# Altium footprint library SMDLibrary.PcbLib: 306 footprints (part 15 of 20)
Each footprint in its own frame and in the unit in brackets; x right, y up, seen from the top. Pads: shape width x height; smd on the part's side, far side on the other; paste and mask are expansions set on the pad; w line width, h text height; cw(c..) or ccw(c..) is an arc to the next point about the centre after c.
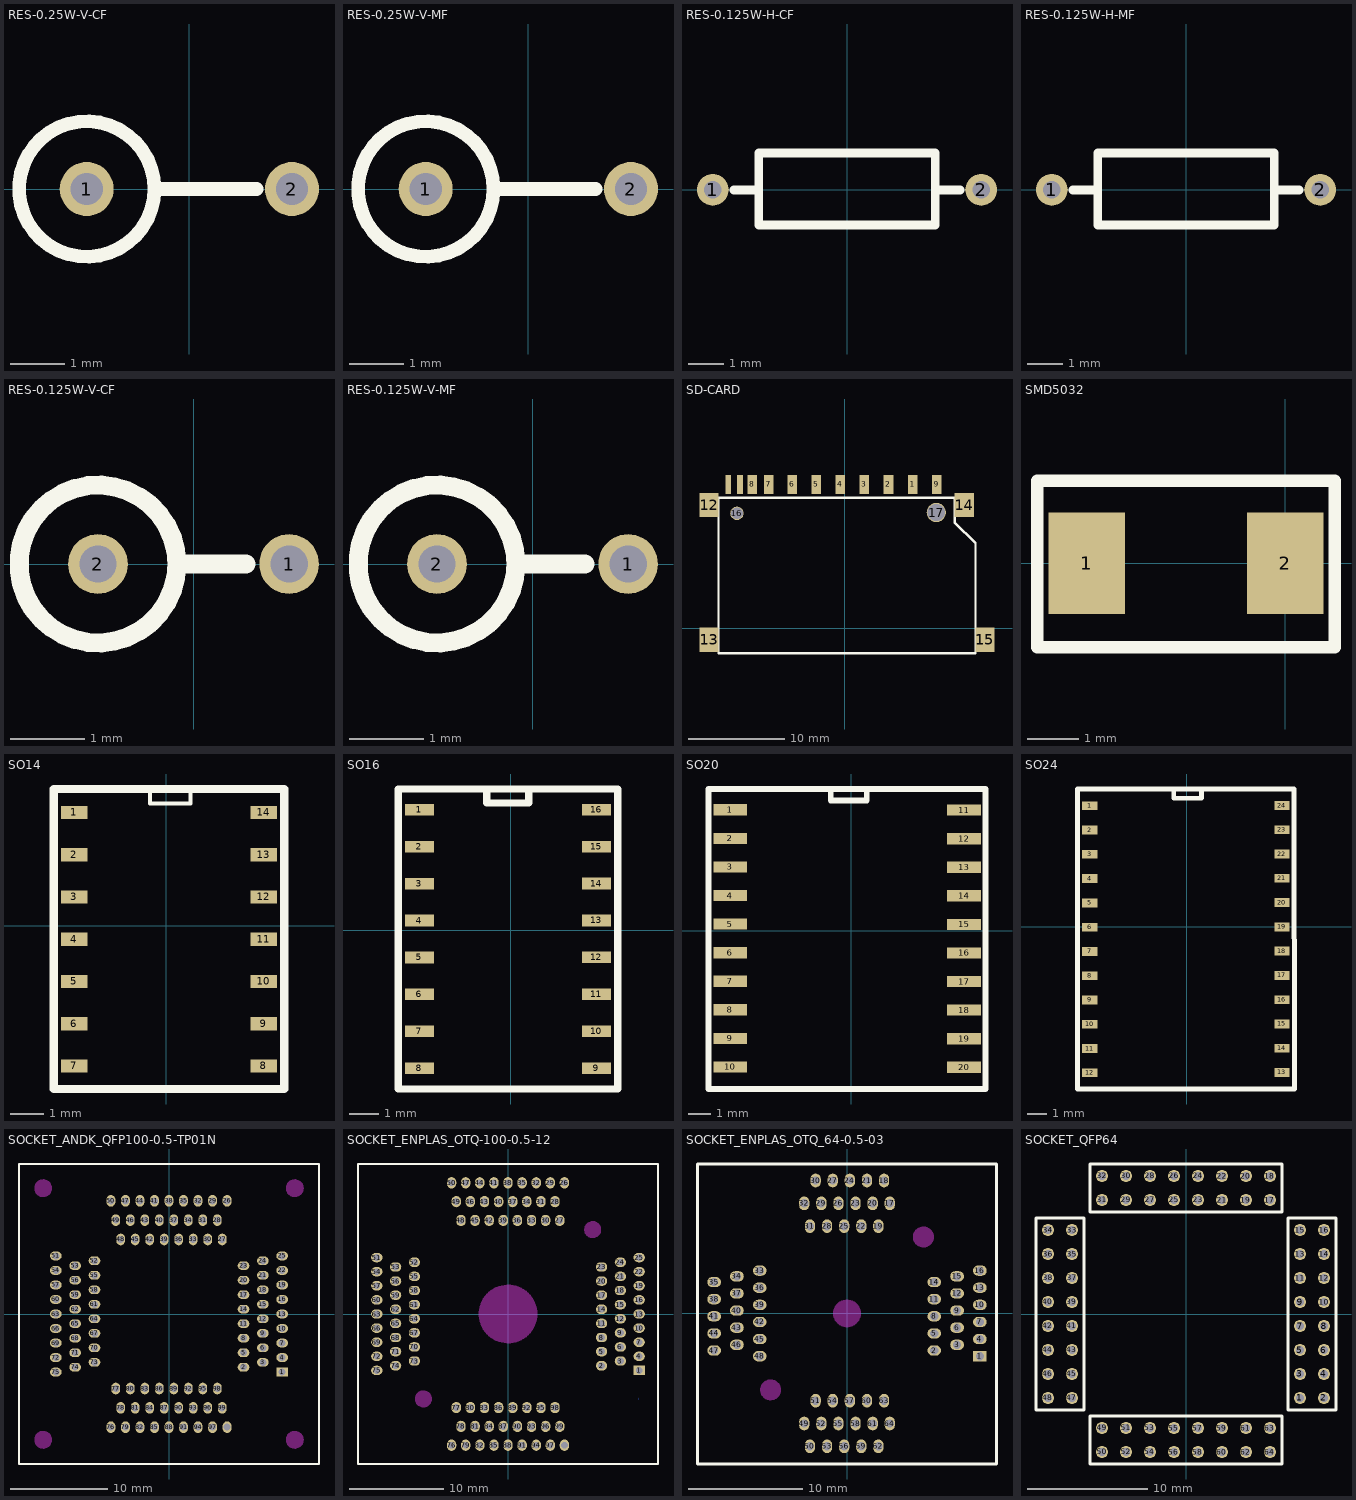
[diagram p14: the footprints below, top view; thin cyan lines are the x and y axes]

## RES-0.25W-V-CF [mm]
pads (2):
  round 1 hole 0.6: 1(-1.9,0) 2(1.9,0)
Top Overlay:
  circle w0.254: c-1.9,0 r1.254
  lines w0.254: -0.646,0 1.25,0
3D body "RES-0.25W-V-CF.stp": height 9.5, standoff -2.5, extent -3.195,-1.297 2.178,1.298

## RES-0.25W-V-MF [mm]
pads (2):
  round 1 hole 0.6: 1(-1.9,0) 2(1.9,0)
Top Overlay:
  circle w0.254: c-1.9,0 r1.254
  lines w0.254: -0.646,0 1.25,0
3D body "RES-0.25W-V-MF.stp": height 9.5, standoff -2.5, extent -3.195,-1.297 2.178,1.298

## RES-0.125W-H-CF [mm]
pads (2):
  round 0.9 hole 0.5: 1(-3.8,0) 2(3.8,0)
Top Overlay:
  lines w0.254: -3.2,0 -2.5,0 ; 2.5,0 3.2,0 ; -2.5,-1 -2.5,1.05 2.5,1.05 2.5,-1 -2.5,-1
3D body "RES-0.125W-H-CF.stp": height 2.2, standoff -2.5, extent -4.033,-1.039 4.035,1.039

## RES-0.125W-H-MF [mm]
pads (2):
  round 0.9 hole 0.5: 1(-3.8,0) 2(3.8,0)
Top Overlay:
  lines w0.254: -3.2,0 -2.5,0 ; 2.5,0 3.2,0 ; -2.5,-1 -2.5,1.05 2.5,1.05 2.5,-1 -2.5,-1
3D body "RES-0.125W-H-MF.stp": height 2.2, standoff -2.5, extent -4.033,-1.039 4.035,1.04

## RES-0.125W-V-CF [mm]
pads (2):
  round 0.8 hole 0.5: 1(1.28,0) 2(-1.28,0)
Top Overlay:
  circle w0.254: c-1.28,0 r1.057
  lines w0.254: -0.2,0 0.7,0
3D body "RES-0.125W-V-CF.stp": height 5.73, standoff -2.5, extent -2.32,-1.039 1.493,1.039

## RES-0.125W-V-MF [mm]
pads (2):
  round 0.8 hole 0.5: 1(1.28,0) 2(-1.28,0)
Top Overlay:
  circle w0.254: c-1.28,0 r1.057
  lines w0.254: -0.2,0 0.7,0
3D body "RES-0.125W-V-MF.stp": height 5.73, standoff -2.5, extent -2.32,-1.039 1.493,1.04

## SD-CARD [mm]
pads (17):
  rect 1x2 smd: 1(7.057,14.947) 2(4.557,14.947) 3(2.057,14.947) 4(-0.443,14.947) 5(-2.943,14.947) 6(-5.443,14.947) 7(-7.868,14.947) 8(-9.568,14.947) 9(9.557,14.947)
  rect 0.6x2 smd: 10(-10.868,14.947) 11(-12.068,14.947)
  rect 2x2.5 smd: 12(-14.068,12.788) 13(-14.068,-1.182) 14(12.411,12.788) 15(14.57,-1.182)
  round 1.4 hole 1.2: 16(-11.168,11.947)
  round 2 hole 1.8: 17(9.522,12.026)
Top Overlay:
  lines w0.254: -13.084,-2.579 13.586,-2.579 13.586,8.851 11.427,11.01 11.427,13.55 -13.084,13.55 -13.084,-2.579
3D body "User Library-SD Kart.step": height 3, standoff -1, extent -14.151,-15.256 14.449,14.744

## SMD5032 [mm]
pads (2):
  rect 1.5x2 smd: 1(-3.9,0) 2(0,0)
Top Overlay:
  lines w0.254: -4.875,-1.65 -4.875,1.625 0.975,1.625 0.975,-1.65 -4.875,-1.65
3D body "User Library-5032_2.STEP": height 1.2, standoff -0.01, extent -4.453,-1.603 0.547,1.597

## SO14 [mm]
pads (14):
  rect 0.8x0.4 smd: 1(-2.76,3.41) 2(-2.76,2.14) 3(-2.76,0.87) 4(-2.76,-0.4) 5(-2.76,-1.67) 6(-2.76,-2.94) 7(-2.76,-4.21) 8(2.935,-4.21) 9(2.935,-2.94) 10(2.935,-1.67) 11(2.935,-0.4) 12(2.935,0.87) 13(2.935,2.14) 14(2.935,3.41)
Top Overlay:
  lines w0.12: -0.483,4.115 -0.483,3.683 0.737,3.683 0.737,4.115
  lines w0.254: -3.378,-4.902 3.556,-4.902 3.556,4.115 -3.378,4.115 -3.378,-4.902
3D body "SW3DPS-SO-14 (PIC16F684)-DEFAULT.STEP": height 1.6, standoff 0, extent -2.92,-4.745 3.07,3.945

## SO16 [mm]
pads (16):
  rect 1x0.4 smd: 1(-3.137,4.14) 2(-3.137,2.87) 3(-3.137,1.6) 4(-3.137,0.33) 5(-3.137,-0.94) 6(-3.137,-2.21) 7(-3.137,-3.48) 8(-3.137,-4.75) 9(2.948,-4.747) 10(2.948,-3.477) 11(2.948,-2.207) 12(2.948,-0.937) 13(2.948,0.333) 14(2.948,1.603) 15(2.948,2.873) 16(2.948,4.143)
Top Overlay:
  lines w0.254: -0.826,4.851 -0.826,4.369 0.622,4.369 0.622,4.686 ; -3.861,-5.461 3.683,-5.461 3.683,4.851 -3.861,4.851 -3.861,-5.461
3D body "User Library-so16-1.STEP": height 1.75, standoff -0.02, extent -3.17,-5.29 2.967,4.68

## SO20 [mm]
pads (20):
  rect 1.5x0.5 smd: 1(-5.383,5.374) 2(-5.383,4.104) 3(-5.383,2.834) 4(-5.383,1.564) 5(-5.383,0.294) 6(-5.383,-0.976) 7(-5.383,-2.246) 8(-5.383,-3.516) 9(-5.383,-4.786) 10(-5.383,-6.056) 11(5.01,5.362) 12(5.01,4.092) 13(5.01,2.822) 14(5.01,1.552) 15(5.01,0.282) 16(5.01,-0.988) 17(5.01,-2.258) 18(5.01,-3.528) 19(5.01,-4.798) 20(5.01,-6.068)
Top Overlay:
  lines w0.254: -0.914,6.248 -0.914,5.791 0.686,5.791 0.686,6.248 ; -6.35,-7.036 5.969,-7.036 5.969,6.299 -6.35,6.299 -6.35,-7.036
3D body "User Library-SOIC20_JEDEC_MS-013AC.STEP": height 2.66, standoff 0, extent -5.536,-6.851 5.094,6.149

## SO24 [mm]
pads (24):
  rect 0.8x0.46 smd: 1(-5.075,6.335) 2(-5.075,5.065) 3(-5.075,3.795) 4(-5.075,2.525) 5(-5.075,1.255) 6(-5.075,-0.015) 7(-5.075,-1.285) 8(-5.075,-2.555) 9(-5.075,-3.825) 10(-5.075,-5.095) 11(-5.075,-6.365) 12(-5.075,-7.635) 13(4.975,-7.62) 14(4.975,-6.35) 15(4.975,-5.08) 16(4.975,-3.81) 17(4.975,-2.54) 18(4.975,-1.27) 19(4.975,0) 20(4.975,1.27) 21(4.975,2.54) 22(4.975,3.81) 23(4.975,5.08) 24(4.975,6.35)
Top Overlay:
  lines w0.254: -0.686,7.188 -0.686,6.731 0.762,6.731 0.762,7.163 ; -5.715,-8.484 -5.715,7.214 5.601,7.214 5.627,-8.484 -5.715,-8.484
3D body "User Library-SO-24W.STEP": height 2.48, standoff 0, extent -5.205,-8.36 5.105,7.05

## SOCKET_ANDK_QFP100-0.5-TP01N [mm]
pads (100):
  rect 1.2x0.9 hole 0.72: 1(11.7,-6)
  oval 1.2x0.9 hole 0.72: 2(7.7,-5.5) 3(9.7,-5) 4(11.7,-4.5) 5(7.7,-4) 6(9.7,-3.5) 7(11.7,-3) 8(7.7,-2.5) 9(9.7,-2) 10(11.7,-1.5) 11(7.7,-1) 12(9.7,-0.5) 13(11.7,0) 14(7.7,0.5) 15(9.7,1) 16(11.7,1.5) 17(7.7,2) 18(9.7,2.5) 19(11.7,3) 20(7.7,3.5) 21(9.7,4) 22(11.7,4.5) 23(7.7,5) 24(9.7,5.5) 25(11.7,6) 51(-11.7,6) 52(-7.7,5.5) 53(-9.7,5) 54(-11.7,4.5) 55(-7.7,4) 56(-9.7,3.5) 57(-11.7,3) 58(-7.7,2.5) 59(-9.7,2) 60(-11.7,1.5) 61(-7.7,1) 62(-9.7,0.5) 63(-11.7,0) 64(-7.7,-0.5) 65(-9.7,-1) 66(-11.7,-1.5) 67(-7.7,-2) 68(-9.7,-2.5) 69(-11.7,-3) 70(-7.7,-3.5) 71(-9.7,-4) 72(-11.7,-4.5) 73(-7.7,-5) 74(-9.7,-5.5) 75(-11.7,-6)
  oval 0.9x1.2 hole 0.72: 26(6,11.7) 27(5.5,7.7) 28(5,9.7) 29(4.5,11.7) 30(4,7.7) 31(3.5,9.7) 32(3,11.7) 33(2.5,7.7) 34(2,9.7) 35(1.5,11.7) 36(1,7.7) 37(0.5,9.7) 38(0,11.7) 39(-0.5,7.7) 40(-1,9.7) 41(-1.5,11.7) 42(-2,7.7) 43(-2.5,9.7) 44(-3,11.7) 45(-3.5,7.7) 46(-4,9.7) 47(-4.5,11.7) 48(-5,7.7) 49(-5.5,9.7) 50(-6,11.7) 76(-6,-11.7) 77(-5.5,-7.7) 78(-5,-9.7) 79(-4.5,-11.7) 80(-4,-7.7) 81(-3.5,-9.7) 82(-3,-11.7) 83(-2.5,-7.7) 84(-2,-9.7) 85(-1.5,-11.7) 86(-1,-7.7) 87(-0.5,-9.7) 88(0,-11.7) 89(0.5,-7.7) 90(1,-9.7) 91(1.5,-11.7) 92(2,-7.7) 93(2.5,-9.7) 94(3,-11.7) 95(3.5,-7.7) 96(4,-9.7) 97(4.5,-11.7) 98(5,-7.7) 99(5.5,-9.7) 100(6,-11.7)
Top Overlay:
  lines w0.254: -15.5,-15.5 15.5,-15.5 15.5,15.5 -15.5,15.5 -15.5,-15.5
Keep-Out Layer:
  board cut-out: -13,12.2 -13.079,12.2 -13.233,12.231 -13.379,12.291 -13.51,12.379 -13.621,12.49 -13.709,12.621 -13.769,12.767 -13.8,12.921 -13.8,13 -13.8,13.079 -13.769,13.233 -13.709,13.379 -13.621,13.51 -13.51,13.621 -13.379,13.709 -13.233,13.769 -13.079,13.8 -13,13.8 -12.921,13.8 -12.767,13.769 -12.621,13.709 -12.49,13.621 -12.379,13.51 -12.291,13.379 -12.231,13.233 -12.2,13.079 -12.2,13 -12.2,12.921 -12.231,12.767 -12.291,12.621 -12.379,12.49 -12.49,12.379 -12.621,12.291 -12.767,12.231 -12.921,12.2
  board cut-out: 13,12.2 12.921,12.2 12.767,12.231 12.621,12.291 12.49,12.379 12.379,12.49 12.291,12.621 12.231,12.767 12.2,12.921 12.2,13 12.2,13.079 12.231,13.233 12.291,13.379 12.379,13.51 12.49,13.621 12.621,13.709 12.767,13.769 12.921,13.8 13,13.8 13.079,13.8 13.233,13.769 13.379,13.709 13.51,13.621 13.621,13.51 13.709,13.379 13.769,13.233 13.8,13.079 13.8,13 13.8,12.921 13.769,12.767 13.709,12.621 13.621,12.49 13.51,12.379 13.379,12.291 13.233,12.231 13.079,12.2
  board cut-out: 12.2,-13 12.2,-13.079 12.231,-13.233 12.291,-13.379 12.379,-13.51 12.49,-13.621 12.621,-13.709 12.767,-13.769 12.921,-13.8 13,-13.8 13.079,-13.8 13.233,-13.769 13.379,-13.709 13.51,-13.621 13.621,-13.51 13.709,-13.379 13.769,-13.233 13.8,-13.079 13.8,-13 13.8,-12.921 13.769,-12.767 13.709,-12.621 13.621,-12.49 13.51,-12.379 13.379,-12.291 13.233,-12.231 13.079,-12.2 13,-12.2 12.921,-12.2 12.767,-12.231 12.621,-12.291 12.49,-12.379 12.379,-12.49 12.291,-12.621 12.231,-12.767 12.2,-12.921
  board cut-out: -13,-13.8 -13.079,-13.8 -13.233,-13.769 -13.379,-13.709 -13.51,-13.621 -13.621,-13.51 -13.709,-13.379 -13.769,-13.233 -13.8,-13.079 -13.8,-13 -13.8,-12.921 -13.769,-12.767 -13.709,-12.621 -13.621,-12.49 -13.51,-12.379 -13.379,-12.291 -13.233,-12.231 -13.079,-12.2 -13,-12.2 -12.921,-12.2 -12.767,-12.231 -12.621,-12.291 -12.49,-12.379 -12.379,-12.49 -12.291,-12.621 -12.231,-12.767 -12.2,-12.921 -12.2,-13 -12.2,-13.079 -12.231,-13.233 -12.291,-13.379 -12.379,-13.51 -12.49,-13.621 -12.621,-13.709 -12.767,-13.769 -12.921,-13.8
Keep-Out Layer:
  circle w0.254: c-13,13 r0.8
  circle w0.254: c13,13 r0.8
  circle w0.254: c13,-13 r0.8
  circle w0.254: c-13,-13 r0.8

## SOCKET_ENPLAS_OTQ-100-0.5-12 [mm]
pads (100):
  rect 1.2x1 hole 0.72: 1(13.95,-6)
  oval 1.2x1 hole 0.72: 2(9.95,-5.5) 3(11.95,-5) 4(13.95,-4.5) 5(9.95,-4) 6(11.95,-3.5) 7(13.95,-3) 8(9.95,-2.5) 9(11.95,-2) 10(13.95,-1.5) 11(9.95,-1) 12(11.95,-0.5) 13(13.95,0) 14(9.95,0.5) 15(11.95,1) 16(13.95,1.5) 17(9.95,2) 18(11.95,2.5) 19(13.95,3) 20(9.95,3.5) 21(11.95,4) 22(13.95,4.5) 23(9.95,5) 24(11.95,5.5) 25(13.95,6) 51(-13.95,6) 52(-9.95,5.5) 53(-11.95,5) 54(-13.95,4.5) 55(-9.95,4) 56(-11.95,3.5) 57(-13.95,3) 58(-9.95,2.5) 59(-11.95,2) 60(-13.95,1.5) 61(-9.95,1) 62(-11.95,0.5) 63(-13.95,0) 64(-9.95,-0.5) 65(-11.95,-1) 66(-13.95,-1.5) 67(-9.95,-2) 68(-11.95,-2.5) 69(-13.95,-3) 70(-9.95,-3.5) 71(-11.95,-4) 72(-13.95,-4.5) 73(-9.95,-5) 74(-11.95,-5.5) 75(-13.95,-6)
  oval 1x1.2 hole 0.72: 26(6,13.95) 27(5.5,9.95) 28(5,11.95) 29(4.5,13.95) 30(4,9.95) 31(3.5,11.95) 32(3,13.95) 33(2.5,9.95) 34(2,11.95) 35(1.5,13.95) 36(1,9.95) 37(0.5,11.95) 38(0,13.95) 39(-0.5,9.95) 40(-1,11.95) 41(-1.5,13.95) 42(-2,9.95) 43(-2.5,11.95) 44(-3,13.95) 45(-3.5,9.95) 46(-4,11.95) 47(-4.5,13.95) 48(-5,9.95) 49(-5.5,11.95) 50(-6,13.95) 76(-6,-13.95) 77(-5.5,-9.95) 78(-5,-11.95) 79(-4.5,-13.95) 80(-4,-9.95) 81(-3.5,-11.95) 82(-3,-13.95) 83(-2.5,-9.95) 84(-2,-11.95) 85(-1.5,-13.95) 86(-1,-9.95) 87(-0.5,-11.95) 88(0,-13.95) 89(0.5,-9.95) 90(1,-11.95) 91(1.5,-13.95) 92(2,-9.95) 93(2.5,-11.95) 94(3,-13.95) 95(3.5,-9.95) 96(4,-11.95) 97(4.5,-13.95) 98(5,-9.95) 99(5.5,-11.95) 100(6,-13.95)
Bottom Layer:
  region: 13.9,-8.889 13.9,-9.139
Top Overlay:
  lines w0.254: -15.95,-15.95 -15.95,15.95 15.95,15.95 15.95,-15.95 -15.95,-15.95
Keep-Out Layer:
  board cut-out: 9,8.2 8.921,8.2 8.767,8.231 8.621,8.291 8.49,8.379 8.379,8.49 8.291,8.621 8.231,8.767 8.2,8.921 8.2,9 8.2,9.079 8.231,9.233 8.291,9.379 8.379,9.51 8.49,9.621 8.621,9.709 8.767,9.769 8.921,9.8 9,9.8 9.079,9.8 9.233,9.769 9.379,9.709 9.51,9.621 9.621,9.51 9.709,9.379 9.769,9.233 9.8,9.079 9.8,9 9.8,8.921 9.769,8.767 9.709,8.621 9.621,8.49 9.51,8.379 9.379,8.291 9.233,8.231 9.079,8.2
  board cut-out: 0.027,-0.163
  board cut-out: 0,-3 -0.197,-3 -0.587,-2.949 -0.966,-2.847 -1.33,-2.696 -1.67,-2.5 -1.982,-2.26 -2.26,-1.982 -2.5,-1.67 -2.696,-1.33 -2.847,-0.966 -2.949,-0.587 -3,-0.197 -3,0 -3,0.197 -2.949,0.587 -2.847,0.966 -2.696,1.33 -2.5,1.67 -2.26,1.982 -1.982,2.26 -1.67,2.5 -1.33,2.696 -0.966,2.847 -0.587,2.949 -0.197,3 0,3 0.197,3 0.587,2.949 0.966,2.847 1.33,2.696 1.67,2.5 1.982,2.26 2.26,1.982 2.5,1.67 2.696,1.33 2.847,0.966 2.949,0.587 3,0.197 3,0 3,-0.197 2.949,-0.587 2.847,-0.966 2.696,-1.33 2.5,-1.67 2.26,-1.982 1.982,-2.26 1.67,-2.5 1.33,-2.696 0.966,-2.847 0.587,-2.949 0.197,-3
  board cut-out: -9,-9.8 -9.079,-9.8 -9.233,-9.769 -9.379,-9.709 -9.51,-9.621 -9.621,-9.51 -9.709,-9.379 -9.769,-9.233 -9.8,-9.079 -9.8,-9 -9.8,-8.921 -9.769,-8.767 -9.709,-8.621 -9.621,-8.49 -9.51,-8.379 -9.379,-8.291 -9.233,-8.231 -9.079,-8.2 -9,-8.2 -8.921,-8.2 -8.767,-8.231 -8.621,-8.291 -8.49,-8.379 -8.379,-8.49 -8.291,-8.621 -8.231,-8.767 -8.2,-8.921 -8.2,-9 -8.2,-9.079 -8.231,-9.233 -8.291,-9.379 -8.379,-9.51 -8.49,-9.621 -8.621,-9.709 -8.767,-9.769 -8.921,-9.8
Keep-Out Layer:
  circle w0.254: c9,8.975 r0.786
  circle w0.254: c-9,-9.025 r0.786
  circle w0.254: c0,0 r3

## SOCKET_ENPLAS_OTQ_64-0.5-03 [mm]
pads (64):
  rect 1.2x0.9 hole 0.72: 1(11.65,-3.75)
  oval 1.2x0.9 hole 0.72: 2(7.65,-3.25) 3(9.65,-2.75) 4(11.65,-2.25) 5(7.65,-1.75) 6(9.65,-1.25) 7(11.65,-0.75) 8(7.65,-0.25) 9(9.65,0.25) 10(11.65,0.75) 11(7.65,1.25) 12(9.65,1.75) 13(11.65,2.25) 14(7.65,2.75) 15(9.65,3.25) 16(11.65,3.75) 33(-7.65,3.75) 34(-9.65,3.25) 35(-11.65,2.75) 36(-7.65,2.25) 37(-9.65,1.75) 38(-11.65,1.25) 39(-7.65,0.75) 40(-9.65,0.25) 41(-11.65,-0.25) 42(-7.65,-0.75) 43(-9.65,-1.25) 44(-11.65,-1.75) 45(-7.65,-2.25) 46(-9.65,-2.75) 47(-11.65,-3.25) 48(-7.65,-3.75)
  oval 0.9x1.2 hole 0.72: 17(3.75,9.65) 18(3.25,11.65) 19(2.75,7.65) 20(2.25,9.65) 21(1.75,11.65) 22(1.25,7.65) 23(0.75,9.65) 24(0.25,11.65) 25(-0.25,7.65) 26(-0.75,9.65) 27(-1.25,11.65) 28(-1.75,7.65) 29(-2.25,9.65) 30(-2.75,11.65) 31(-3.25,7.65) 32(-3.75,9.65) 49(-3.75,-9.65) 50(-3.25,-11.65) 51(-2.75,-7.65) 52(-2.25,-9.65) 53(-1.75,-11.65) 54(-1.25,-7.65) 55(-0.75,-9.65) 56(-0.25,-11.65) 57(0.25,-7.65) 58(0.75,-9.65) 59(1.25,-11.65) 60(1.75,-7.65) 61(2.25,-9.65) 62(2.75,-11.65) 63(3.25,-7.65) 64(3.75,-9.65)
Top Overlay:
  lines w0.254: -13.1,-13.2 13.1,-13.2 13.1,13.1 0,13.1 -13.1,13.1 -13.1,-11.65 -13.1,-13.2
Keep-Out Layer:
  board cut-out: -6.7,-7.5 -6.779,-7.5 -6.933,-7.469 -7.079,-7.409 -7.21,-7.321 -7.321,-7.21 -7.409,-7.079 -7.469,-6.933 -7.5,-6.779 -7.5,-6.7 -7.5,-6.621 -7.469,-6.467 -7.409,-6.321 -7.321,-6.19 -7.21,-6.079 -7.079,-5.991 -6.933,-5.931 -6.779,-5.9 -6.7,-5.9 -6.621,-5.9 -6.467,-5.931 -6.321,-5.991 -6.19,-6.079 -6.079,-6.19 -5.991,-6.321 -5.931,-6.467 -5.9,-6.621 -5.9,-6.7 -5.9,-6.779 -5.931,-6.933 -5.991,-7.079 -6.079,-7.21 -6.19,-7.321 -6.321,-7.409 -6.467,-7.469 -6.621,-7.5
  board cut-out: 6.7,5.9 6.621,5.9 6.467,5.931 6.321,5.991 6.19,6.079 6.079,6.19 5.991,6.321 5.931,6.467 5.9,6.621 5.9,6.7 5.9,6.779 5.931,6.933 5.991,7.079 6.079,7.21 6.19,7.321 6.321,7.409 6.467,7.469 6.621,7.5 6.7,7.5 6.779,7.5 6.933,7.469 7.079,7.409 7.21,7.321 7.321,7.21 7.409,7.079 7.469,6.933 7.5,6.779 7.5,6.7 7.5,6.621 7.469,6.467 7.409,6.321 7.321,6.19 7.21,6.079 7.079,5.991 6.933,5.931 6.779,5.9
  board cut-out: 0,-1.1 -0.108,-1.1 -0.321,-1.058 -0.521,-0.975 -0.701,-0.854 -0.854,-0.701 -0.975,-0.521 -1.058,-0.321 -1.1,-0.108 -1.1,0 -1.1,0.108 -1.058,0.321 -0.975,0.521 -0.854,0.701 -0.701,0.854 -0.521,0.975 -0.321,1.058 -0.108,1.1 0,1.1 0.108,1.1 0.321,1.058 0.521,0.975 0.701,0.854 0.854,0.701 0.975,0.521 1.058,0.321 1.1,0.108 1.1,0 1.1,-0.108 1.058,-0.321 0.975,-0.521 0.854,-0.701 0.701,-0.854 0.521,-0.975 0.321,-1.058 0.108,-1.1
Keep-Out Layer:
  circle w0.254: c0,0 r1.1
  circle w0.254: c6.7,6.7 r0.8
  circle w0.254: c-6.7,-6.7 r0.8

## SOCKET_QFP64 [mm]
pads (64):
  round 1 hole 0.65: 1(9.5,-7) 2(11.5,-7) 3(9.5,-5) 4(11.5,-5) 5(9.5,-3) 6(11.5,-3) 7(9.5,-1) 8(11.5,-1) 9(9.5,1) 10(11.5,1) 11(9.5,3) 12(11.5,3) 13(9.5,5) 14(11.5,5) 15(9.5,7) 16(11.5,7) 17(7,9.5) 18(7,11.5) 19(5,9.5) 20(5,11.5) 21(3,9.5) 22(3,11.5) 23(1,9.5) 24(1,11.5) 25(-1,9.5) 26(-1,11.5) 27(-3,9.5) 28(-3,11.5) 29(-5,9.5) 30(-5,11.5) 31(-7,9.5) 32(-7,11.5) 33(-9.5,7) 34(-11.5,7) 35(-9.5,5) 36(-11.5,5) 37(-9.5,3) 38(-11.5,3) 39(-9.5,1) 40(-11.5,1) 41(-9.5,-1) 42(-11.5,-1) 43(-9.5,-3) 44(-11.5,-3) 45(-9.5,-5) 46(-11.5,-5) 47(-9.5,-7) 48(-11.5,-7) 49(-7,-9.5) 50(-7,-11.5) 51(-5,-9.5) 52(-5,-11.5) 53(-3,-9.5) 54(-3,-11.5) 55(-1,-9.5) 56(-1,-11.5) 57(1,-9.5) 58(1,-11.5) 59(3,-9.5) 60(3,-11.5) 61(5,-9.5) 62(5,-11.5) 63(7,-9.5) 64(7,-11.5)
Top Overlay:
  lines w0.254: -12.5,-8 -12.5,-8 ; -12.5,-8 -12.5,8 -8.5,8 -8.5,-8 -12.5,-8 ; -8,12.5 -8,12.5 ; -8,12.5 8,12.5 8,8.5 -8,8.5 -8,12.5 ; 8,-12.5 8,-12.5 ; 8,-12.5 -8,-12.5 -8,-8.5 8,-8.5 8,-12.5 ; 12.5,8 12.5,8 ; 12.5,8 12.5,-8 8.5,-8 8.5,8 12.5,8
3D body "pin header 1x1 pitch 2mm heigth 5mm.stp": height 6.01, standoff -2.69, extent -8,8.5 -6,10.5
3D body "pin header 1x1 pitch 2mm heigth 5mm.stp": height 6.01, standoff -2.69, extent -8,10.5 -6,12.5
3D body "pin header 1x1 pitch 2mm heigth 5mm.stp": height 6.01, standoff -2.69, extent -6,8.5 -4,10.5
3D body "pin header 1x1 pitch 2mm heigth 5mm.stp": height 6.01, standoff -2.69, extent -6,10.5 -4,12.5
3D body "pin header 1x1 pitch 2mm heigth 5mm.stp": height 6.01, standoff -2.69, extent -4,8.5 -2,10.5
3D body "pin header 1x1 pitch 2mm heigth 5mm.stp": height 6.01, standoff -2.69, extent -2,8.5 0,10.5
3D body "pin header 1x1 pitch 2mm heigth 5mm.stp": height 6.01, standoff -2.69, extent 0,8.5 2,10.5
3D body "pin header 1x1 pitch 2mm heigth 5mm.stp": height 6.01, standoff -2.69, extent -4,10.5 -2,12.5
3D body "pin header 1x1 pitch 2mm heigth 5mm.stp": height 6.01, standoff -2.69, extent -2,10.5 0,12.5
3D body "pin header 1x1 pitch 2mm heigth 5mm.stp": height 6.01, standoff -2.69, extent 0,10.5 2,12.5
3D body "pin header 1x1 pitch 2mm heigth 5mm.stp": height 6.01, standoff -2.69, extent 2,10.5 4,12.5
3D body "pin header 1x1 pitch 2mm heigth 5mm.stp": height 6.01, standoff -2.69, extent 2,8.5 4,10.5
3D body "pin header 1x1 pitch 2mm heigth 5mm.stp": height 6.01, standoff -2.69, extent 4,8.5 6,10.5
3D body "pin header 1x1 pitch 2mm heigth 5mm.stp": height 6.01, standoff -2.69, extent 4,10.5 6,12.5
3D body "pin header 1x1 pitch 2mm heigth 5mm.stp": height 6.01, standoff -2.69, extent 6,8.5 8,10.5
3D body "pin header 1x1 pitch 2mm heigth 5mm.stp": height 6.01, standoff -2.69, extent 6,10.5 8,12.5
3D body "pin header 1x1 pitch 2mm heigth 5mm.stp": height 6.01, standoff -2.69, extent -10.5,-8 -8.5,-6
3D body "pin header 1x1 pitch 2mm heigth 5mm.stp": height 6.01, standoff -2.69, extent -12.5,-8 -10.5,-6
3D body "pin header 1x1 pitch 2mm heigth 5mm.stp": height 6.01, standoff -2.69, extent -10.5,-6 -8.5,-4
3D body "pin header 1x1 pitch 2mm heigth 5mm.stp": height 6.01, standoff -2.69, extent -12.5,-6 -10.5,-4
3D body "pin header 1x1 pitch 2mm heigth 5mm.stp": height 6.01, standoff -2.69, extent -10.5,-4 -8.5,-2
3D body "pin header 1x1 pitch 2mm heigth 5mm.stp": height 6.01, standoff -2.69, extent -10.5,-2 -8.5,0
3D body "pin header 1x1 pitch 2mm heigth 5mm.stp": height 6.01, standoff -2.69, extent -10.5,0 -8.5,2
3D body "pin header 1x1 pitch 2mm heigth 5mm.stp": height 6.01, standoff -2.69, extent -12.5,-4 -10.5,-2
3D body "pin header 1x1 pitch 2mm heigth 5mm.stp": height 6.01, standoff -2.69, extent -12.5,-2 -10.5,0
3D body "pin header 1x1 pitch 2mm heigth 5mm.stp": height 6.01, standoff -2.69, extent -12.5,0 -10.5,2
3D body "pin header 1x1 pitch 2mm heigth 5mm.stp": height 6.01, standoff -2.69, extent -12.5,2 -10.5,4
3D body "pin header 1x1 pitch 2mm heigth 5mm.stp": height 6.01, standoff -2.69, extent -10.5,2 -8.5,4
3D body "pin header 1x1 pitch 2mm heigth 5mm.stp": height 6.01, standoff -2.69, extent -10.5,4 -8.5,6
3D body "pin header 1x1 pitch 2mm heigth 5mm.stp": height 6.01, standoff -2.69, extent -12.5,4 -10.5,6
3D body "pin header 1x1 pitch 2mm heigth 5mm.stp": height 6.01, standoff -2.69, extent -10.5,6 -8.5,8
3D body "pin header 1x1 pitch 2mm heigth 5mm.stp": height 6.01, standoff -2.69, extent -12.5,6 -10.5,8
3D body "pin header 1x1 pitch 2mm heigth 5mm.stp": height 6.01, standoff -2.69, extent 6,-10.5 8,-8.5
3D body "pin header 1x1 pitch 2mm heigth 5mm.stp": height 6.01, standoff -2.69, extent 6,-12.5 8,-10.5
3D body "pin header 1x1 pitch 2mm heigth 5mm.stp": height 6.01, standoff -2.69, extent 4,-10.5 6,-8.5
3D body "pin header 1x1 pitch 2mm heigth 5mm.stp": height 6.01, standoff -2.69, extent 4,-12.5 6,-10.5
3D body "pin header 1x1 pitch 2mm heigth 5mm.stp": height 6.01, standoff -2.69, extent 2,-10.5 4,-8.5
3D body "pin header 1x1 pitch 2mm heigth 5mm.stp": height 6.01, standoff -2.69, extent 0,-10.5 2,-8.5
3D body "pin header 1x1 pitch 2mm heigth 5mm.stp": height 6.01, standoff -2.69, extent -2,-10.5 0,-8.5
3D body "pin header 1x1 pitch 2mm heigth 5mm.stp": height 6.01, standoff -2.69, extent 2,-12.5 4,-10.5
3D body "pin header 1x1 pitch 2mm heigth 5mm.stp": height 6.01, standoff -2.69, extent 0,-12.5 2,-10.5
3D body "pin header 1x1 pitch 2mm heigth 5mm.stp": height 6.01, standoff -2.69, extent -2,-12.5 0,-10.5
3D body "pin header 1x1 pitch 2mm heigth 5mm.stp": height 6.01, standoff -2.69, extent -4,-12.5 -2,-10.5
3D body "pin header 1x1 pitch 2mm heigth 5mm.stp": height 6.01, standoff -2.69, extent -4,-10.5 -2,-8.5
3D body "pin header 1x1 pitch 2mm heigth 5mm.stp": height 6.01, standoff -2.69, extent -6,-10.5 -4,-8.5
3D body "pin header 1x1 pitch 2mm heigth 5mm.stp": height 6.01, standoff -2.69, extent -6,-12.5 -4,-10.5
3D body "pin header 1x1 pitch 2mm heigth 5mm.stp": height 6.01, standoff -2.69, extent -8,-10.5 -6,-8.5
3D body "pin header 1x1 pitch 2mm heigth 5mm.stp": height 6.01, standoff -2.69, extent -8,-12.5 -6,-10.5
3D body "pin header 1x1 pitch 2mm heigth 5mm.stp": height 6.01, standoff -2.69, extent 8.5,6 10.5,8
3D body "pin header 1x1 pitch 2mm heigth 5mm.stp": height 6.01, standoff -2.69, extent 10.5,6 12.5,8
3D body "pin header 1x1 pitch 2mm heigth 5mm.stp": height 6.01, standoff -2.69, extent 8.5,4 10.5,6
3D body "pin header 1x1 pitch 2mm heigth 5mm.stp": height 6.01, standoff -2.69, extent 10.5,4 12.5,6
3D body "pin header 1x1 pitch 2mm heigth 5mm.stp": height 6.01, standoff -2.69, extent 8.5,2 10.5,4
3D body "pin header 1x1 pitch 2mm heigth 5mm.stp": height 6.01, standoff -2.69, extent 8.5,0 10.5,2
3D body "pin header 1x1 pitch 2mm heigth 5mm.stp": height 6.01, standoff -2.69, extent 8.5,-2 10.5,0
3D body "pin header 1x1 pitch 2mm heigth 5mm.stp": height 6.01, standoff -2.69, extent 10.5,2 12.5,4
3D body "pin header 1x1 pitch 2mm heigth 5mm.stp": height 6.01, standoff -2.69, extent 10.5,0 12.5,2
3D body "pin header 1x1 pitch 2mm heigth 5mm.stp": height 6.01, standoff -2.69, extent 10.5,-2 12.5,0
3D body "pin header 1x1 pitch 2mm heigth 5mm.stp": height 6.01, standoff -2.69, extent 10.5,-4 12.5,-2
3D body "pin header 1x1 pitch 2mm heigth 5mm.stp": height 6.01, standoff -2.69, extent 8.5,-4 10.5,-2
3D body "pin header 1x1 pitch 2mm heigth 5mm.stp": height 6.01, standoff -2.69, extent 8.5,-6 10.5,-4
3D body "pin header 1x1 pitch 2mm heigth 5mm.stp": height 6.01, standoff -2.69, extent 10.5,-6 12.5,-4
3D body "pin header 1x1 pitch 2mm heigth 5mm.stp": height 6.01, standoff -2.69, extent 8.5,-8 10.5,-6
3D body "pin header 1x1 pitch 2mm heigth 5mm.stp": height 6.01, standoff -2.69, extent 10.5,-8 12.5,-6